# Altium footprint library Connector_PinHeader_1.00mm.PcbLib: 278 footprints (part 5 of 18)
Each footprint in its own frame and in the unit in brackets; x right, y up, seen from the top. Pads: shape width x height; smd on the part's side, far side on the other; paste and mask are expansions set on the pad; w line width, h text height; cw(c..) or ccw(c..) is an arc to the next point about the centre after c.
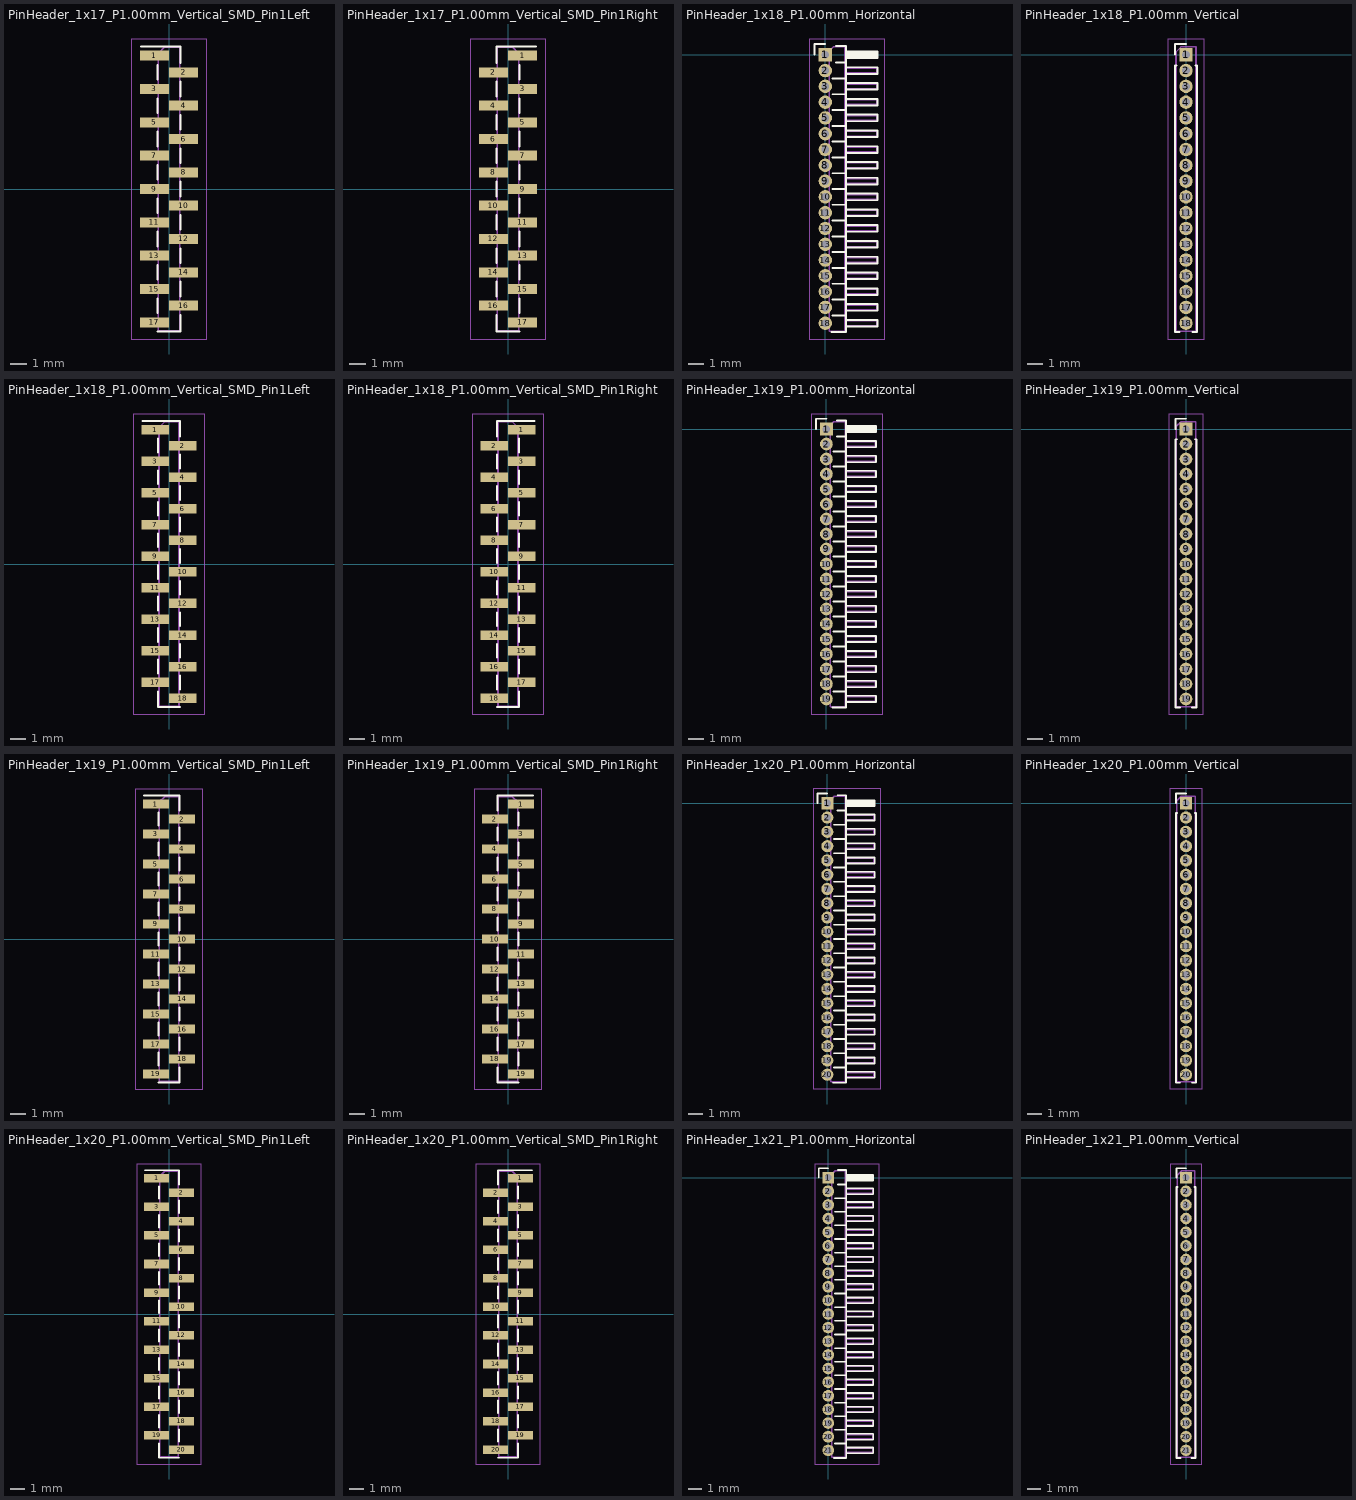
[diagram p4: the footprints below, top view; thin cyan lines are the x and y axes]

## PinHeader_1x17_P1.00mm_Vertical_SMD_Pin1Left [mm]
pads (17):
  rect 1.75x0.6 smd: 1(-0.875,8) 2(0.875,7) 3(-0.875,6) 4(0.875,5) 5(-0.875,4) 6(0.875,3) 7(-0.875,2) 8(0.875,1) 9(-0.875,0) 10(0.875,-1) 11(-0.875,-2) 12(0.875,-3) 13(-0.875,-4) 14(0.875,-5) 15(-0.875,-6) 16(0.875,-7) 17(-0.875,-8)
F.SilkS:
  lines w0.12: -1.69,8.56 -0.695,8.56 0.695,8.56 0.695,7.56 ; -0.695,-8.56 0.695,-8.56 0.695,-7.56 ; -0.695,-7.44 -0.695,-6.56 ; -0.695,-5.44 -0.695,-4.56 ; -0.695,-3.44 -0.695,-2.56 ; -0.695,-1.44 -0.695,-0.56 ; -0.695,0.56 -0.695,1.44 ; -0.695,2.56 -0.695,3.44 ; -0.695,4.56 -0.695,5.44 ; -0.695,6.56 -0.695,7.44 ; 0.695,-6.44 0.695,-5.56 ; 0.695,-4.44 0.695,-3.56 ; 0.695,-2.44 0.695,-1.56 ; 0.695,-0.44 0.695,0.44 ; 0.695,1.56 0.695,2.44 ; 0.695,3.56 0.695,4.44 ; 0.695,5.56 0.695,6.44
F.CrtYd:
  lines w0.05: -2.25,-9 2.25,-9 2.25,9 -2.25,9 -2.25,-9
F.Fab:
  lines w0.1: -0.635,-8.15 -1.25,-8.15 -1.25,-7.85 -0.635,-7.85 ; -0.635,-6.15 -1.25,-6.15 -1.25,-5.85 -0.635,-5.85 ; -0.635,-4.15 -1.25,-4.15 -1.25,-3.85 -0.635,-3.85 ; -0.635,-2.15 -1.25,-2.15 -1.25,-1.85 -0.635,-1.85 ; -0.635,-0.15 -1.25,-0.15 -1.25,0.15 -0.635,0.15 ; -0.635,1.85 -1.25,1.85 -1.25,2.15 -0.635,2.15 ; -0.635,3.85 -1.25,3.85 -1.25,4.15 -0.635,4.15 ; -0.635,5.85 -1.25,5.85 -1.25,6.15 -0.635,6.15 ; -0.635,7.85 -1.25,7.85 -1.25,8.15 -0.635,8.15 ; 0.635,-7.15 1.25,-7.15 1.25,-6.85 0.635,-6.85 ; 0.635,-5.15 1.25,-5.15 1.25,-4.85 0.635,-4.85 ; 0.635,-3.15 1.25,-3.15 1.25,-2.85 0.635,-2.85 ; 0.635,-1.15 1.25,-1.15 1.25,-0.85 0.635,-0.85 ; 0.635,0.85 1.25,0.85 1.25,1.15 0.635,1.15 ; 0.635,2.85 1.25,2.85 1.25,3.15 0.635,3.15 ; 0.635,4.85 1.25,4.85 1.25,5.15 0.635,5.15 ; 0.635,6.85 1.25,6.85 1.25,7.15 0.635,7.15 ; -0.635,8.15 -0.635,-8.5 0.635,-8.5 0.635,8.5 -0.285,8.5 -0.635,8.15
  text "'.Designator'" at 0.84,-4.047 h1

## PinHeader_1x17_P1.00mm_Vertical_SMD_Pin1Right [mm]
pads (17):
  rect 1.75x0.6 smd: 1(0.875,8) 2(-0.875,7) 3(0.875,6) 4(-0.875,5) 5(0.875,4) 6(-0.875,3) 7(0.875,2) 8(-0.875,1) 9(0.875,0) 10(-0.875,-1) 11(0.875,-2) 12(-0.875,-3) 13(0.875,-4) 14(-0.875,-5) 15(0.875,-6) 16(-0.875,-7) 17(0.875,-8)
F.SilkS:
  lines w0.12: -0.695,-7.56 -0.695,-8.56 0.695,-8.56 ; -0.695,-6.44 -0.695,-5.56 ; -0.695,-4.44 -0.695,-3.56 ; -0.695,-2.44 -0.695,-1.56 ; -0.695,-0.44 -0.695,0.44 ; -0.695,1.56 -0.695,2.44 ; -0.695,3.56 -0.695,4.44 ; -0.695,5.56 -0.695,6.44 ; -0.695,8.44 -0.695,7.56 -0.695,8.56 0.695,8.56 1.69,8.56 ; 0.695,-7.44 0.695,-6.56 ; 0.695,-5.44 0.695,-4.56 ; 0.695,-3.44 0.695,-2.56 ; 0.695,-1.44 0.695,-0.56 ; 0.695,0.56 0.695,1.44 ; 0.695,2.56 0.695,3.44 ; 0.695,4.56 0.695,5.44 ; 0.695,6.56 0.695,7.44
F.CrtYd:
  lines w0.05: -2.25,-9 -2.25,9 2.25,9 2.25,-9 -2.25,-9
F.Fab:
  lines w0.1: -0.635,-7.15 -1.25,-7.15 -1.25,-6.85 -0.635,-6.85 ; -0.635,-5.15 -1.25,-5.15 -1.25,-4.85 -0.635,-4.85 ; -0.635,-3.15 -1.25,-3.15 -1.25,-2.85 -0.635,-2.85 ; -0.635,-1.15 -1.25,-1.15 -1.25,-0.85 -0.635,-0.85 ; -0.635,0.85 -1.25,0.85 -1.25,1.15 -0.635,1.15 ; -0.635,2.85 -1.25,2.85 -1.25,3.15 -0.635,3.15 ; -0.635,4.85 -1.25,4.85 -1.25,5.15 -0.635,5.15 ; -0.635,6.85 -1.25,6.85 -1.25,7.15 -0.635,7.15 ; 0.635,-8.15 1.25,-8.15 1.25,-7.85 0.635,-7.85 ; 0.635,-6.15 1.25,-6.15 1.25,-5.85 0.635,-5.85 ; 0.635,-4.15 1.25,-4.15 1.25,-3.85 0.635,-3.85 ; 0.635,-2.15 1.25,-2.15 1.25,-1.85 0.635,-1.85 ; 0.635,-0.15 1.25,-0.15 1.25,0.15 0.635,0.15 ; 0.635,1.85 1.25,1.85 1.25,2.15 0.635,2.15 ; 0.635,3.85 1.25,3.85 1.25,4.15 0.635,4.15 ; 0.635,5.85 1.25,5.85 1.25,6.15 0.635,6.15 ; 0.635,7.85 1.25,7.85 1.25,8.15 0.635,8.15 ; 0.635,8.15 0.285,8.5 -0.635,8.5 -0.635,-8.5 0.635,-8.5 0.635,8.15
  text "'.Designator'" at 0.84,-4.047 h1

## PinHeader_1x18_P1.00mm_Horizontal [mm]
pads (18):
  rect 0.85x0.85 hole 0.5: 1(0,0)
  rrect100% 0.85x0.85 hole 0.5: 2(0,-1) 3(0,-2) 4(0,-3) 5(0,-4) 6(0,-5) 7(0,-6) 8(0,-7) 9(0,-8) 10(0,-9) 11(0,-10) 12(0,-11) 13(0,-12) 14(0,-13) 15(0,-14) 16(0,-15) 17(0,-16) 18(0,-17)
F.SilkS:
  lines w0.12: -0.685,0 -0.685,0.685 0,0.685 ; 0.394,-17.56 1.31,-17.56 1.31,0.56 0.685,0.56 ; 0.468,-16.5 1.31,-16.5 ; 0.468,-15.5 1.31,-15.5 ; 0.468,-14.5 1.31,-14.5 ; 0.468,-13.5 1.31,-13.5 ; 0.468,-12.5 1.31,-12.5 ; 0.468,-11.5 1.31,-11.5 ; 0.468,-10.5 1.31,-10.5 ; 0.468,-9.5 1.31,-9.5 ; 0.468,-8.5 1.31,-8.5 ; 0.468,-7.5 1.31,-7.5 ; 0.468,-6.5 1.31,-6.5 ; 0.468,-5.5 1.31,-5.5 ; 0.468,-4.5 1.31,-4.5 ; 0.468,-3.5 1.31,-3.5 ; 0.468,-2.5 1.31,-2.5 ; 0.468,-1.5 1.31,-1.5 ; 0.685,-0.5 1.31,-0.5 ; 1.31,-17.21 3.31,-17.21 3.31,-16.79 1.31,-16.79 ; 1.31,-16.21 3.31,-16.21 3.31,-15.79 1.31,-15.79 ; 1.31,-15.21 3.31,-15.21 3.31,-14.79 1.31,-14.79 ; 1.31,-14.21 3.31,-14.21 3.31,-13.79 1.31,-13.79 ; 1.31,-13.21 3.31,-13.21 3.31,-12.79 1.31,-12.79 ; 1.31,-12.21 3.31,-12.21 3.31,-11.79 1.31,-11.79 ; 1.31,-11.21 3.31,-11.21 3.31,-10.79 1.31,-10.79 ; 1.31,-10.21 3.31,-10.21 3.31,-9.79 1.31,-9.79 ; 1.31,-9.21 3.31,-9.21 3.31,-8.79 1.31,-8.79 ; 1.31,-8.21 3.31,-8.21 3.31,-7.79 1.31,-7.79 ; 1.31,-7.21 3.31,-7.21 3.31,-6.79 1.31,-6.79 ; 1.31,-6.21 3.31,-6.21 3.31,-5.79 1.31,-5.79 ; 1.31,-5.21 3.31,-5.21 3.31,-4.79 1.31,-4.79 ; 1.31,-4.21 3.31,-4.21 3.31,-3.79 1.31,-3.79 ; 1.31,-3.21 3.31,-3.21 3.31,-2.79 1.31,-2.79 ; 1.31,-2.21 3.31,-2.21 3.31,-1.79 1.31,-1.79 ; 1.31,-1.21 3.31,-1.21 3.31,-0.79 1.31,-0.79 ; 1.31,-0.21 3.31,-0.21 3.31,0.21 1.31,0.21 ; 1.31,-0.09 3.31,-0.09 ; 1.31,0.03 3.31,0.03 ; 1.31,0.15 3.31,0.15
F.CrtYd:
  lines w0.05: -1,-18 3.75,-18 3.75,1 -1,1 -1,-18
F.Fab:
  lines w0.1: 0.25,-17.15 -0.15,-17.15 -0.15,-16.85 0.25,-16.85 ; 0.25,-16.15 -0.15,-16.15 -0.15,-15.85 0.25,-15.85 ; 0.25,-15.15 -0.15,-15.15 -0.15,-14.85 0.25,-14.85 ; 0.25,-14.15 -0.15,-14.15 -0.15,-13.85 0.25,-13.85 ; 0.25,-13.15 -0.15,-13.15 -0.15,-12.85 0.25,-12.85 ; 0.25,-12.15 -0.15,-12.15 -0.15,-11.85 0.25,-11.85 ; 0.25,-11.15 -0.15,-11.15 -0.15,-10.85 0.25,-10.85 ; 0.25,-10.15 -0.15,-10.15 -0.15,-9.85 0.25,-9.85 ; 0.25,-9.15 -0.15,-9.15 -0.15,-8.85 0.25,-8.85 ; 0.25,-8.15 -0.15,-8.15 -0.15,-7.85 0.25,-7.85 ; 0.25,-7.15 -0.15,-7.15 -0.15,-6.85 0.25,-6.85 ; 0.25,-6.15 -0.15,-6.15 -0.15,-5.85 0.25,-5.85 ; 0.25,-5.15 -0.15,-5.15 -0.15,-4.85 0.25,-4.85 ; 0.25,-4.15 -0.15,-4.15 -0.15,-3.85 0.25,-3.85 ; 0.25,-3.15 -0.15,-3.15 -0.15,-2.85 0.25,-2.85 ; 0.25,-2.15 -0.15,-2.15 -0.15,-1.85 0.25,-1.85 ; 0.25,-1.15 -0.15,-1.15 -0.15,-0.85 0.25,-0.85 ; 0.25,-0.15 -0.15,-0.15 -0.15,0.15 0.25,0.15 ; 1.25,-17.15 3.25,-17.15 3.25,-16.85 1.25,-16.85 ; 1.25,-16.15 3.25,-16.15 3.25,-15.85 1.25,-15.85 ; 1.25,-15.15 3.25,-15.15 3.25,-14.85 1.25,-14.85 ; 1.25,-14.15 3.25,-14.15 3.25,-13.85 1.25,-13.85 ; 1.25,-13.15 3.25,-13.15 3.25,-12.85 1.25,-12.85 ; 1.25,-12.15 3.25,-12.15 3.25,-11.85 1.25,-11.85 ; 1.25,-11.15 3.25,-11.15 3.25,-10.85 1.25,-10.85 ; 1.25,-10.15 3.25,-10.15 3.25,-9.85 1.25,-9.85 ; 1.25,-9.15 3.25,-9.15 3.25,-8.85 1.25,-8.85 ; 1.25,-8.15 3.25,-8.15 3.25,-7.85 1.25,-7.85 ; 1.25,-7.15 3.25,-7.15 3.25,-6.85 1.25,-6.85 ; 1.25,-6.15 3.25,-6.15 3.25,-5.85 1.25,-5.85 ; 1.25,-5.15 3.25,-5.15 3.25,-4.85 1.25,-4.85 ; 1.25,-4.15 3.25,-4.15 3.25,-3.85 1.25,-3.85 ; 1.25,-3.15 3.25,-3.15 3.25,-2.85 1.25,-2.85 ; 1.25,-2.15 3.25,-2.15 3.25,-1.85 1.25,-1.85 ; 1.25,-1.15 3.25,-1.15 3.25,-0.85 1.25,-0.85 ; 1.25,-0.15 3.25,-0.15 3.25,0.15 1.25,0.15 ; 0.25,-17.5 0.25,0.25 0.5,0.5 1.25,0.5 1.25,-17.5 0.25,-17.5
  text "'.Designator'" at 1.254,-10.928 h0.6

## PinHeader_1x18_P1.00mm_Vertical [mm]
pads (18):
  rect 0.85x0.85 hole 0.5: 1(0,0)
  rrect100% 0.85x0.85 hole 0.5: 2(0,-1) 3(0,-2) 4(0,-3) 5(0,-4) 6(0,-5) 7(0,-6) 8(0,-7) 9(0,-8) 10(0,-9) 11(0,-10) 12(0,-11) 13(0,-12) 14(0,-13) 15(0,-14) 16(0,-15) 17(0,-16) 18(0,-17)
F.SilkS:
  lines w0.12: -0.695,0 -0.695,0.685 0,0.685 ; -0.608,-0.685 -0.695,-0.685 -0.695,-17.56 -0.394,-17.56 ; 0.394,-17.56 0.695,-17.56 0.695,-0.685 0.608,-0.685
F.CrtYd:
  lines w0.05: -1.15,-18 1.15,-18 1.15,1 -1.15,1 -1.15,-18
F.Fab:
  lines w0.1: -0.635,-17.5 -0.635,0.182 -0.318,0.5 0.635,0.5 0.635,-17.5 -0.635,-17.5
  text "'.Designator'" at 0.639,-11.576 h0.76

## PinHeader_1x18_P1.00mm_Vertical_SMD_Pin1Left [mm]
pads (18):
  rect 1.75x0.6 smd: 1(-0.875,8.5) 2(0.875,7.5) 3(-0.875,6.5) 4(0.875,5.5) 5(-0.875,4.5) 6(0.875,3.5) 7(-0.875,2.5) 8(0.875,1.5) 9(-0.875,0.5) 10(0.875,-0.5) 11(-0.875,-1.5) 12(0.875,-2.5) 13(-0.875,-3.5) 14(0.875,-4.5) 15(-0.875,-5.5) 16(0.875,-6.5) 17(-0.875,-7.5) 18(0.875,-8.5)
F.SilkS:
  lines w0.12: -1.69,9.06 -0.695,9.06 0.695,9.06 0.695,8.06 ; -0.695,-8.06 -0.695,-9.06 0.695,-9.06 ; -0.695,-6.94 -0.695,-6.06 ; -0.695,-4.94 -0.695,-4.06 ; -0.695,-2.94 -0.695,-2.06 ; -0.695,-0.94 -0.695,-0.06 ; -0.695,1.06 -0.695,1.94 ; -0.695,3.06 -0.695,3.94 ; -0.695,5.06 -0.695,5.94 ; -0.695,7.06 -0.695,7.94 ; 0.695,-7.94 0.695,-7.06 ; 0.695,-5.94 0.695,-5.06 ; 0.695,-3.94 0.695,-3.06 ; 0.695,-1.94 0.695,-1.06 ; 0.695,0.06 0.695,0.94 ; 0.695,2.06 0.695,2.94 ; 0.695,4.06 0.695,4.94 ; 0.695,6.06 0.695,6.94
F.CrtYd:
  lines w0.05: -2.25,-9.5 -2.25,9.5 2.25,9.5 2.25,-9.5 -2.25,-9.5
F.Fab:
  lines w0.1: -0.635,-7.65 -1.25,-7.65 -1.25,-7.35 -0.635,-7.35 ; -0.635,-5.65 -1.25,-5.65 -1.25,-5.35 -0.635,-5.35 ; -0.635,-3.65 -1.25,-3.65 -1.25,-3.35 -0.635,-3.35 ; -0.635,-1.65 -1.25,-1.65 -1.25,-1.35 -0.635,-1.35 ; -0.635,0.35 -1.25,0.35 -1.25,0.65 -0.635,0.65 ; -0.635,2.35 -1.25,2.35 -1.25,2.65 -0.635,2.65 ; -0.635,4.35 -1.25,4.35 -1.25,4.65 -0.635,4.65 ; -0.635,6.35 -1.25,6.35 -1.25,6.65 -0.635,6.65 ; -0.635,8.35 -1.25,8.35 -1.25,8.65 -0.635,8.65 ; 0.635,-8.65 1.25,-8.65 1.25,-8.35 0.635,-8.35 ; 0.635,-6.65 1.25,-6.65 1.25,-6.35 0.635,-6.35 ; 0.635,-4.65 1.25,-4.65 1.25,-4.35 0.635,-4.35 ; 0.635,-2.65 1.25,-2.65 1.25,-2.35 0.635,-2.35 ; 0.635,-0.65 1.25,-0.65 1.25,-0.35 0.635,-0.35 ; 0.635,1.35 1.25,1.35 1.25,1.65 0.635,1.65 ; 0.635,3.35 1.25,3.35 1.25,3.65 0.635,3.65 ; 0.635,5.35 1.25,5.35 1.25,5.65 0.635,5.65 ; 0.635,7.35 1.25,7.35 1.25,7.65 0.635,7.65 ; -0.635,8.65 -0.285,9 0.635,9 0.635,-9 -0.635,-9 -0.635,8.65
  text "'.Designator'" at 0.84,-4.047 h1

## PinHeader_1x18_P1.00mm_Vertical_SMD_Pin1Right [mm]
pads (18):
  rect 1.75x0.6 smd: 1(0.875,8.5) 2(-0.875,7.5) 3(0.875,6.5) 4(-0.875,5.5) 5(0.875,4.5) 6(-0.875,3.5) 7(0.875,2.5) 8(-0.875,1.5) 9(0.875,0.5) 10(-0.875,-0.5) 11(0.875,-1.5) 12(-0.875,-2.5) 13(0.875,-3.5) 14(-0.875,-4.5) 15(0.875,-5.5) 16(-0.875,-6.5) 17(0.875,-7.5) 18(-0.875,-8.5)
F.SilkS:
  lines w0.12: -0.695,-9.06 0.695,-9.06 0.695,-8.06 ; -0.695,-7.94 -0.695,-7.06 ; -0.695,-5.94 -0.695,-5.06 ; -0.695,-3.94 -0.695,-3.06 ; -0.695,-1.94 -0.695,-1.06 ; -0.695,0.06 -0.695,0.94 ; -0.695,2.06 -0.695,2.94 ; -0.695,4.06 -0.695,4.94 ; -0.695,6.06 -0.695,6.94 ; -0.695,8.94 -0.695,8.06 -0.695,9.06 0.695,9.06 1.69,9.06 ; 0.695,-6.94 0.695,-6.06 ; 0.695,-4.94 0.695,-4.06 ; 0.695,-2.94 0.695,-2.06 ; 0.695,-0.94 0.695,-0.06 ; 0.695,1.06 0.695,1.94 ; 0.695,3.06 0.695,3.94 ; 0.695,5.06 0.695,5.94 ; 0.695,7.06 0.695,7.94
F.CrtYd:
  lines w0.05: -2.25,-9.5 2.25,-9.5 2.25,9.5 -2.25,9.5 -2.25,-9.5
F.Fab:
  lines w0.1: -0.635,-8.65 -1.25,-8.65 -1.25,-8.35 -0.635,-8.35 ; -0.635,-6.65 -1.25,-6.65 -1.25,-6.35 -0.635,-6.35 ; -0.635,-4.65 -1.25,-4.65 -1.25,-4.35 -0.635,-4.35 ; -0.635,-2.65 -1.25,-2.65 -1.25,-2.35 -0.635,-2.35 ; -0.635,-0.65 -1.25,-0.65 -1.25,-0.35 -0.635,-0.35 ; -0.635,1.35 -1.25,1.35 -1.25,1.65 -0.635,1.65 ; -0.635,3.35 -1.25,3.35 -1.25,3.65 -0.635,3.65 ; -0.635,5.35 -1.25,5.35 -1.25,5.65 -0.635,5.65 ; -0.635,7.35 -1.25,7.35 -1.25,7.65 -0.635,7.65 ; 0.635,-7.65 1.25,-7.65 1.25,-7.35 0.635,-7.35 ; 0.635,-5.65 1.25,-5.65 1.25,-5.35 0.635,-5.35 ; 0.635,-3.65 1.25,-3.65 1.25,-3.35 0.635,-3.35 ; 0.635,-1.65 1.25,-1.65 1.25,-1.35 0.635,-1.35 ; 0.635,0.35 1.25,0.35 1.25,0.65 0.635,0.65 ; 0.635,2.35 1.25,2.35 1.25,2.65 0.635,2.65 ; 0.635,4.35 1.25,4.35 1.25,4.65 0.635,4.65 ; 0.635,6.35 1.25,6.35 1.25,6.65 0.635,6.65 ; 0.635,8.35 1.25,8.35 1.25,8.65 0.635,8.65 ; 0.635,8.65 0.285,9 -0.635,9 -0.635,-9 0.635,-9 0.635,8.65
  text "'.Designator'" at 0.84,-4.047 h1

## PinHeader_1x19_P1.00mm_Horizontal [mm]
pads (19):
  rect 0.85x0.85 hole 0.5: 1(0,0)
  rrect100% 0.85x0.85 hole 0.5: 2(0,-1) 3(0,-2) 4(0,-3) 5(0,-4) 6(0,-5) 7(0,-6) 8(0,-7) 9(0,-8) 10(0,-9) 11(0,-10) 12(0,-11) 13(0,-12) 14(0,-13) 15(0,-14) 16(0,-15) 17(0,-16) 18(0,-17) 19(0,-18)
F.SilkS:
  lines w0.12: -0.685,0 -0.685,0.685 0,0.685 ; 0.394,-18.56 1.31,-18.56 1.31,0.56 0.685,0.56 ; 0.468,-17.5 1.31,-17.5 ; 0.468,-16.5 1.31,-16.5 ; 0.468,-15.5 1.31,-15.5 ; 0.468,-14.5 1.31,-14.5 ; 0.468,-13.5 1.31,-13.5 ; 0.468,-12.5 1.31,-12.5 ; 0.468,-11.5 1.31,-11.5 ; 0.468,-10.5 1.31,-10.5 ; 0.468,-9.5 1.31,-9.5 ; 0.468,-8.5 1.31,-8.5 ; 0.468,-7.5 1.31,-7.5 ; 0.468,-6.5 1.31,-6.5 ; 0.468,-5.5 1.31,-5.5 ; 0.468,-4.5 1.31,-4.5 ; 0.468,-3.5 1.31,-3.5 ; 0.468,-2.5 1.31,-2.5 ; 0.468,-1.5 1.31,-1.5 ; 0.685,-0.5 1.31,-0.5 ; 1.31,-18.21 3.31,-18.21 3.31,-17.79 1.31,-17.79 ; 1.31,-17.21 3.31,-17.21 3.31,-16.79 1.31,-16.79 ; 1.31,-16.21 3.31,-16.21 3.31,-15.79 1.31,-15.79 ; 1.31,-15.21 3.31,-15.21 3.31,-14.79 1.31,-14.79 ; 1.31,-14.21 3.31,-14.21 3.31,-13.79 1.31,-13.79 ; 1.31,-13.21 3.31,-13.21 3.31,-12.79 1.31,-12.79 ; 1.31,-12.21 3.31,-12.21 3.31,-11.79 1.31,-11.79 ; 1.31,-11.21 3.31,-11.21 3.31,-10.79 1.31,-10.79 ; 1.31,-10.21 3.31,-10.21 3.31,-9.79 1.31,-9.79 ; 1.31,-9.21 3.31,-9.21 3.31,-8.79 1.31,-8.79 ; 1.31,-8.21 3.31,-8.21 3.31,-7.79 1.31,-7.79 ; 1.31,-7.21 3.31,-7.21 3.31,-6.79 1.31,-6.79 ; 1.31,-6.21 3.31,-6.21 3.31,-5.79 1.31,-5.79 ; 1.31,-5.21 3.31,-5.21 3.31,-4.79 1.31,-4.79 ; 1.31,-4.21 3.31,-4.21 3.31,-3.79 1.31,-3.79 ; 1.31,-3.21 3.31,-3.21 3.31,-2.79 1.31,-2.79 ; 1.31,-2.21 3.31,-2.21 3.31,-1.79 1.31,-1.79 ; 1.31,-1.21 3.31,-1.21 3.31,-0.79 1.31,-0.79 ; 1.31,-0.21 3.31,-0.21 3.31,0.21 1.31,0.21 ; 1.31,-0.09 3.31,-0.09 ; 1.31,0.03 3.31,0.03 ; 1.31,0.15 3.31,0.15
F.CrtYd:
  lines w0.05: -1,-19 3.75,-19 3.75,1 -1,1 -1,-19
F.Fab:
  lines w0.1: 0.25,-18.15 -0.15,-18.15 -0.15,-17.85 0.25,-17.85 ; 0.25,-17.15 -0.15,-17.15 -0.15,-16.85 0.25,-16.85 ; 0.25,-16.15 -0.15,-16.15 -0.15,-15.85 0.25,-15.85 ; 0.25,-15.15 -0.15,-15.15 -0.15,-14.85 0.25,-14.85 ; 0.25,-14.15 -0.15,-14.15 -0.15,-13.85 0.25,-13.85 ; 0.25,-13.15 -0.15,-13.15 -0.15,-12.85 0.25,-12.85 ; 0.25,-12.15 -0.15,-12.15 -0.15,-11.85 0.25,-11.85 ; 0.25,-11.15 -0.15,-11.15 -0.15,-10.85 0.25,-10.85 ; 0.25,-10.15 -0.15,-10.15 -0.15,-9.85 0.25,-9.85 ; 0.25,-9.15 -0.15,-9.15 -0.15,-8.85 0.25,-8.85 ; 0.25,-8.15 -0.15,-8.15 -0.15,-7.85 0.25,-7.85 ; 0.25,-7.15 -0.15,-7.15 -0.15,-6.85 0.25,-6.85 ; 0.25,-6.15 -0.15,-6.15 -0.15,-5.85 0.25,-5.85 ; 0.25,-5.15 -0.15,-5.15 -0.15,-4.85 0.25,-4.85 ; 0.25,-4.15 -0.15,-4.15 -0.15,-3.85 0.25,-3.85 ; 0.25,-3.15 -0.15,-3.15 -0.15,-2.85 0.25,-2.85 ; 0.25,-2.15 -0.15,-2.15 -0.15,-1.85 0.25,-1.85 ; 0.25,-1.15 -0.15,-1.15 -0.15,-0.85 0.25,-0.85 ; 0.25,-0.15 -0.15,-0.15 -0.15,0.15 0.25,0.15 ; 1.25,-18.15 3.25,-18.15 3.25,-17.85 1.25,-17.85 ; 1.25,-17.15 3.25,-17.15 3.25,-16.85 1.25,-16.85 ; 1.25,-16.15 3.25,-16.15 3.25,-15.85 1.25,-15.85 ; 1.25,-15.15 3.25,-15.15 3.25,-14.85 1.25,-14.85 ; 1.25,-14.15 3.25,-14.15 3.25,-13.85 1.25,-13.85 ; 1.25,-13.15 3.25,-13.15 3.25,-12.85 1.25,-12.85 ; 1.25,-12.15 3.25,-12.15 3.25,-11.85 1.25,-11.85 ; 1.25,-11.15 3.25,-11.15 3.25,-10.85 1.25,-10.85 ; 1.25,-10.15 3.25,-10.15 3.25,-9.85 1.25,-9.85 ; 1.25,-9.15 3.25,-9.15 3.25,-8.85 1.25,-8.85 ; 1.25,-8.15 3.25,-8.15 3.25,-7.85 1.25,-7.85 ; 1.25,-7.15 3.25,-7.15 3.25,-6.85 1.25,-6.85 ; 1.25,-6.15 3.25,-6.15 3.25,-5.85 1.25,-5.85 ; 1.25,-5.15 3.25,-5.15 3.25,-4.85 1.25,-4.85 ; 1.25,-4.15 3.25,-4.15 3.25,-3.85 1.25,-3.85 ; 1.25,-3.15 3.25,-3.15 3.25,-2.85 1.25,-2.85 ; 1.25,-2.15 3.25,-2.15 3.25,-1.85 1.25,-1.85 ; 1.25,-1.15 3.25,-1.15 3.25,-0.85 1.25,-0.85 ; 1.25,-0.15 3.25,-0.15 3.25,0.15 1.25,0.15 ; 0.25,-18.5 0.25,0.25 0.5,0.5 1.25,0.5 1.25,-18.5 0.25,-18.5
  text "'.Designator'" at 1.254,-11.428 h0.6

## PinHeader_1x19_P1.00mm_Vertical [mm]
pads (19):
  rect 0.85x0.85 hole 0.5: 1(0,0)
  rrect100% 0.85x0.85 hole 0.5: 2(0,-1) 3(0,-2) 4(0,-3) 5(0,-4) 6(0,-5) 7(0,-6) 8(0,-7) 9(0,-8) 10(0,-9) 11(0,-10) 12(0,-11) 13(0,-12) 14(0,-13) 15(0,-14) 16(0,-15) 17(0,-16) 18(0,-17) 19(0,-18)
F.SilkS:
  lines w0.12: -0.695,0 -0.695,0.685 0,0.685 ; -0.608,-0.685 -0.695,-0.685 -0.695,-18.56 -0.394,-18.56 ; 0.394,-18.56 0.695,-18.56 0.695,-0.685 0.608,-0.685
F.CrtYd:
  lines w0.05: -1.15,-19 1.15,-19 1.15,1 -1.15,1 -1.15,-19
F.Fab:
  lines w0.1: -0.635,-18.5 0.635,-18.5 0.635,0.5 -0.318,0.5 -0.635,0.182 -0.635,-18.5
  text "'.Designator'" at 0.639,-12.076 h0.76

## PinHeader_1x19_P1.00mm_Vertical_SMD_Pin1Left [mm]
pads (19):
  rect 1.75x0.6 smd: 1(-0.875,9) 2(0.875,8) 3(-0.875,7) 4(0.875,6) 5(-0.875,5) 6(0.875,4) 7(-0.875,3) 8(0.875,2) 9(-0.875,1) 10(0.875,0) 11(-0.875,-1) 12(0.875,-2) 13(-0.875,-3) 14(0.875,-4) 15(-0.875,-5) 16(0.875,-6) 17(-0.875,-7) 18(0.875,-8) 19(-0.875,-9)
F.SilkS:
  lines w0.12: -1.69,9.56 -0.695,9.56 0.695,9.56 0.695,8.56 ; -0.695,-9.56 0.695,-9.56 0.695,-8.56 ; -0.695,-8.44 -0.695,-7.56 ; -0.695,-6.44 -0.695,-5.56 ; -0.695,-4.44 -0.695,-3.56 ; -0.695,-2.44 -0.695,-1.56 ; -0.695,-0.44 -0.695,0.44 ; -0.695,1.56 -0.695,2.44 ; -0.695,3.56 -0.695,4.44 ; -0.695,5.56 -0.695,6.44 ; -0.695,7.56 -0.695,8.44 ; 0.695,-7.44 0.695,-6.56 ; 0.695,-5.44 0.695,-4.56 ; 0.695,-3.44 0.695,-2.56 ; 0.695,-1.44 0.695,-0.56 ; 0.695,0.56 0.695,1.44 ; 0.695,2.56 0.695,3.44 ; 0.695,4.56 0.695,5.44 ; 0.695,6.56 0.695,7.44
F.CrtYd:
  lines w0.05: -2.25,-10 -2.25,10 2.25,10 2.25,-10 -2.25,-10
F.Fab:
  lines w0.1: -0.635,-9.15 -1.25,-9.15 -1.25,-8.85 -0.635,-8.85 ; -0.635,-7.15 -1.25,-7.15 -1.25,-6.85 -0.635,-6.85 ; -0.635,-5.15 -1.25,-5.15 -1.25,-4.85 -0.635,-4.85 ; -0.635,-3.15 -1.25,-3.15 -1.25,-2.85 -0.635,-2.85 ; -0.635,-1.15 -1.25,-1.15 -1.25,-0.85 -0.635,-0.85 ; -0.635,0.85 -1.25,0.85 -1.25,1.15 -0.635,1.15 ; -0.635,2.85 -1.25,2.85 -1.25,3.15 -0.635,3.15 ; -0.635,4.85 -1.25,4.85 -1.25,5.15 -0.635,5.15 ; -0.635,6.85 -1.25,6.85 -1.25,7.15 -0.635,7.15 ; -0.635,8.85 -1.25,8.85 -1.25,9.15 -0.635,9.15 ; 0.635,-8.15 1.25,-8.15 1.25,-7.85 0.635,-7.85 ; 0.635,-6.15 1.25,-6.15 1.25,-5.85 0.635,-5.85 ; 0.635,-4.15 1.25,-4.15 1.25,-3.85 0.635,-3.85 ; 0.635,-2.15 1.25,-2.15 1.25,-1.85 0.635,-1.85 ; 0.635,-0.15 1.25,-0.15 1.25,0.15 0.635,0.15 ; 0.635,1.85 1.25,1.85 1.25,2.15 0.635,2.15 ; 0.635,3.85 1.25,3.85 1.25,4.15 0.635,4.15 ; 0.635,5.85 1.25,5.85 1.25,6.15 0.635,6.15 ; 0.635,7.85 1.25,7.85 1.25,8.15 0.635,8.15 ; -0.635,9.15 -0.635,-9.5 0.635,-9.5 0.635,9.5 -0.285,9.5 -0.635,9.15
  text "'.Designator'" at 0.84,-4.047 h1

## PinHeader_1x19_P1.00mm_Vertical_SMD_Pin1Right [mm]
pads (19):
  rect 1.75x0.6 smd: 1(0.875,9) 2(-0.875,8) 3(0.875,7) 4(-0.875,6) 5(0.875,5) 6(-0.875,4) 7(0.875,3) 8(-0.875,2) 9(0.875,1) 10(-0.875,0) 11(0.875,-1) 12(-0.875,-2) 13(0.875,-3) 14(-0.875,-4) 15(0.875,-5) 16(-0.875,-6) 17(0.875,-7) 18(-0.875,-8) 19(0.875,-9)
F.SilkS:
  lines w0.12: -0.695,-8.56 -0.695,-9.56 0.695,-9.56 ; -0.695,-7.44 -0.695,-6.56 ; -0.695,-5.44 -0.695,-4.56 ; -0.695,-3.44 -0.695,-2.56 ; -0.695,-1.44 -0.695,-0.56 ; -0.695,0.56 -0.695,1.44 ; -0.695,2.56 -0.695,3.44 ; -0.695,4.56 -0.695,5.44 ; -0.695,6.56 -0.695,7.44 ; -0.695,9.44 -0.695,8.56 -0.695,9.56 0.695,9.56 1.69,9.56 ; 0.695,-8.44 0.695,-7.56 ; 0.695,-6.44 0.695,-5.56 ; 0.695,-4.44 0.695,-3.56 ; 0.695,-2.44 0.695,-1.56 ; 0.695,-0.44 0.695,0.44 ; 0.695,1.56 0.695,2.44 ; 0.695,3.56 0.695,4.44 ; 0.695,5.56 0.695,6.44 ; 0.695,7.56 0.695,8.44
F.CrtYd:
  lines w0.05: -2.25,-10 -2.25,10 2.25,10 2.25,-10 -2.25,-10
F.Fab:
  lines w0.1: -0.635,-8.15 -1.25,-8.15 -1.25,-7.85 -0.635,-7.85 ; -0.635,-6.15 -1.25,-6.15 -1.25,-5.85 -0.635,-5.85 ; -0.635,-4.15 -1.25,-4.15 -1.25,-3.85 -0.635,-3.85 ; -0.635,-2.15 -1.25,-2.15 -1.25,-1.85 -0.635,-1.85 ; -0.635,-0.15 -1.25,-0.15 -1.25,0.15 -0.635,0.15 ; -0.635,1.85 -1.25,1.85 -1.25,2.15 -0.635,2.15 ; -0.635,3.85 -1.25,3.85 -1.25,4.15 -0.635,4.15 ; -0.635,5.85 -1.25,5.85 -1.25,6.15 -0.635,6.15 ; -0.635,7.85 -1.25,7.85 -1.25,8.15 -0.635,8.15 ; 0.635,-9.15 1.25,-9.15 1.25,-8.85 0.635,-8.85 ; 0.635,-7.15 1.25,-7.15 1.25,-6.85 0.635,-6.85 ; 0.635,-5.15 1.25,-5.15 1.25,-4.85 0.635,-4.85 ; 0.635,-3.15 1.25,-3.15 1.25,-2.85 0.635,-2.85 ; 0.635,-1.15 1.25,-1.15 1.25,-0.85 0.635,-0.85 ; 0.635,0.85 1.25,0.85 1.25,1.15 0.635,1.15 ; 0.635,2.85 1.25,2.85 1.25,3.15 0.635,3.15 ; 0.635,4.85 1.25,4.85 1.25,5.15 0.635,5.15 ; 0.635,6.85 1.25,6.85 1.25,7.15 0.635,7.15 ; 0.635,8.85 1.25,8.85 1.25,9.15 0.635,9.15 ; 0.635,9.15 0.635,-9.5 -0.635,-9.5 -0.635,9.5 0.285,9.5 0.635,9.15
  text "'.Designator'" at 0.84,-4.047 h1

## PinHeader_1x20_P1.00mm_Horizontal [mm]
pads (20):
  rect 0.85x0.85 hole 0.5: 1(0,0)
  rrect100% 0.85x0.85 hole 0.5: 2(0,-1) 3(0,-2) 4(0,-3) 5(0,-4) 6(0,-5) 7(0,-6) 8(0,-7) 9(0,-8) 10(0,-9) 11(0,-10) 12(0,-11) 13(0,-12) 14(0,-13) 15(0,-14) 16(0,-15) 17(0,-16) 18(0,-17) 19(0,-18) 20(0,-19)
F.SilkS:
  lines w0.12: -0.685,0 -0.685,0.685 0,0.685 ; 0.394,-19.56 1.31,-19.56 1.31,0.56 0.685,0.56 ; 0.468,-18.5 1.31,-18.5 ; 0.468,-17.5 1.31,-17.5 ; 0.468,-16.5 1.31,-16.5 ; 0.468,-15.5 1.31,-15.5 ; 0.468,-14.5 1.31,-14.5 ; 0.468,-13.5 1.31,-13.5 ; 0.468,-12.5 1.31,-12.5 ; 0.468,-11.5 1.31,-11.5 ; 0.468,-10.5 1.31,-10.5 ; 0.468,-9.5 1.31,-9.5 ; 0.468,-8.5 1.31,-8.5 ; 0.468,-7.5 1.31,-7.5 ; 0.468,-6.5 1.31,-6.5 ; 0.468,-5.5 1.31,-5.5 ; 0.468,-4.5 1.31,-4.5 ; 0.468,-3.5 1.31,-3.5 ; 0.468,-2.5 1.31,-2.5 ; 0.468,-1.5 1.31,-1.5 ; 0.685,-0.5 1.31,-0.5 ; 1.31,-19.21 3.31,-19.21 3.31,-18.79 1.31,-18.79 ; 1.31,-18.21 3.31,-18.21 3.31,-17.79 1.31,-17.79 ; 1.31,-17.21 3.31,-17.21 3.31,-16.79 1.31,-16.79 ; 1.31,-16.21 3.31,-16.21 3.31,-15.79 1.31,-15.79 ; 1.31,-15.21 3.31,-15.21 3.31,-14.79 1.31,-14.79 ; 1.31,-14.21 3.31,-14.21 3.31,-13.79 1.31,-13.79 ; 1.31,-13.21 3.31,-13.21 3.31,-12.79 1.31,-12.79 ; 1.31,-12.21 3.31,-12.21 3.31,-11.79 1.31,-11.79 ; 1.31,-11.21 3.31,-11.21 3.31,-10.79 1.31,-10.79 ; 1.31,-10.21 3.31,-10.21 3.31,-9.79 1.31,-9.79 ; 1.31,-9.21 3.31,-9.21 3.31,-8.79 1.31,-8.79 ; 1.31,-8.21 3.31,-8.21 3.31,-7.79 1.31,-7.79 ; 1.31,-7.21 3.31,-7.21 3.31,-6.79 1.31,-6.79 ; 1.31,-6.21 3.31,-6.21 3.31,-5.79 1.31,-5.79 ; 1.31,-5.21 3.31,-5.21 3.31,-4.79 1.31,-4.79 ; 1.31,-4.21 3.31,-4.21 3.31,-3.79 1.31,-3.79 ; 1.31,-3.21 3.31,-3.21 3.31,-2.79 1.31,-2.79 ; 1.31,-2.21 3.31,-2.21 3.31,-1.79 1.31,-1.79 ; 1.31,-1.21 3.31,-1.21 3.31,-0.79 1.31,-0.79 ; 1.31,-0.21 3.31,-0.21 3.31,0.21 1.31,0.21 ; 1.31,-0.09 3.31,-0.09 ; 1.31,0.03 3.31,0.03 ; 1.31,0.15 3.31,0.15
F.CrtYd:
  lines w0.05: -1,-20 3.75,-20 3.75,1 -1,1 -1,-20
F.Fab:
  lines w0.1: 0.25,-19.15 -0.15,-19.15 -0.15,-18.85 0.25,-18.85 ; 0.25,-18.15 -0.15,-18.15 -0.15,-17.85 0.25,-17.85 ; 0.25,-17.15 -0.15,-17.15 -0.15,-16.85 0.25,-16.85 ; 0.25,-16.15 -0.15,-16.15 -0.15,-15.85 0.25,-15.85 ; 0.25,-15.15 -0.15,-15.15 -0.15,-14.85 0.25,-14.85 ; 0.25,-14.15 -0.15,-14.15 -0.15,-13.85 0.25,-13.85 ; 0.25,-13.15 -0.15,-13.15 -0.15,-12.85 0.25,-12.85 ; 0.25,-12.15 -0.15,-12.15 -0.15,-11.85 0.25,-11.85 ; 0.25,-11.15 -0.15,-11.15 -0.15,-10.85 0.25,-10.85 ; 0.25,-10.15 -0.15,-10.15 -0.15,-9.85 0.25,-9.85 ; 0.25,-9.15 -0.15,-9.15 -0.15,-8.85 0.25,-8.85 ; 0.25,-8.15 -0.15,-8.15 -0.15,-7.85 0.25,-7.85 ; 0.25,-7.15 -0.15,-7.15 -0.15,-6.85 0.25,-6.85 ; 0.25,-6.15 -0.15,-6.15 -0.15,-5.85 0.25,-5.85 ; 0.25,-5.15 -0.15,-5.15 -0.15,-4.85 0.25,-4.85 ; 0.25,-4.15 -0.15,-4.15 -0.15,-3.85 0.25,-3.85 ; 0.25,-3.15 -0.15,-3.15 -0.15,-2.85 0.25,-2.85 ; 0.25,-2.15 -0.15,-2.15 -0.15,-1.85 0.25,-1.85 ; 0.25,-1.15 -0.15,-1.15 -0.15,-0.85 0.25,-0.85 ; 0.25,-0.15 -0.15,-0.15 -0.15,0.15 0.25,0.15 ; 1.25,-19.15 3.25,-19.15 3.25,-18.85 1.25,-18.85 ; 1.25,-18.15 3.25,-18.15 3.25,-17.85 1.25,-17.85 ; 1.25,-17.15 3.25,-17.15 3.25,-16.85 1.25,-16.85 ; 1.25,-16.15 3.25,-16.15 3.25,-15.85 1.25,-15.85 ; 1.25,-15.15 3.25,-15.15 3.25,-14.85 1.25,-14.85 ; 1.25,-14.15 3.25,-14.15 3.25,-13.85 1.25,-13.85 ; 1.25,-13.15 3.25,-13.15 3.25,-12.85 1.25,-12.85 ; 1.25,-12.15 3.25,-12.15 3.25,-11.85 1.25,-11.85 ; 1.25,-11.15 3.25,-11.15 3.25,-10.85 1.25,-10.85 ; 1.25,-10.15 3.25,-10.15 3.25,-9.85 1.25,-9.85 ; 1.25,-9.15 3.25,-9.15 3.25,-8.85 1.25,-8.85 ; 1.25,-8.15 3.25,-8.15 3.25,-7.85 1.25,-7.85 ; 1.25,-7.15 3.25,-7.15 3.25,-6.85 1.25,-6.85 ; 1.25,-6.15 3.25,-6.15 3.25,-5.85 1.25,-5.85 ; 1.25,-5.15 3.25,-5.15 3.25,-4.85 1.25,-4.85 ; 1.25,-4.15 3.25,-4.15 3.25,-3.85 1.25,-3.85 ; 1.25,-3.15 3.25,-3.15 3.25,-2.85 1.25,-2.85 ; 1.25,-2.15 3.25,-2.15 3.25,-1.85 1.25,-1.85 ; 1.25,-1.15 3.25,-1.15 3.25,-0.85 1.25,-0.85 ; 1.25,-0.15 3.25,-0.15 3.25,0.15 1.25,0.15 ; 0.25,-19.5 1.25,-19.5 1.25,0.5 0.5,0.5 0.25,0.25 0.25,-19.5
  text "'.Designator'" at 1.254,-11.928 h0.6

## PinHeader_1x20_P1.00mm_Vertical [mm]
pads (20):
  rect 0.85x0.85 hole 0.5: 1(0,0)
  rrect100% 0.85x0.85 hole 0.5: 2(0,-1) 3(0,-2) 4(0,-3) 5(0,-4) 6(0,-5) 7(0,-6) 8(0,-7) 9(0,-8) 10(0,-9) 11(0,-10) 12(0,-11) 13(0,-12) 14(0,-13) 15(0,-14) 16(0,-15) 17(0,-16) 18(0,-17) 19(0,-18) 20(0,-19)
F.SilkS:
  lines w0.12: -0.695,0 -0.695,0.685 0,0.685 ; -0.608,-0.685 -0.695,-0.685 -0.695,-19.56 -0.394,-19.56 ; 0.394,-19.56 0.695,-19.56 0.695,-0.685 0.608,-0.685
F.CrtYd:
  lines w0.05: -1.15,-20 1.15,-20 1.15,1 -1.15,1 -1.15,-20
F.Fab:
  lines w0.1: -0.635,-19.5 0.635,-19.5 0.635,0.5 -0.318,0.5 -0.635,0.182 -0.635,-19.5
  text "'.Designator'" at 0.639,-12.576 h0.76

## PinHeader_1x20_P1.00mm_Vertical_SMD_Pin1Left [mm]
pads (20):
  rect 1.75x0.6 smd: 1(-0.875,9.5) 2(0.875,8.5) 3(-0.875,7.5) 4(0.875,6.5) 5(-0.875,5.5) 6(0.875,4.5) 7(-0.875,3.5) 8(0.875,2.5) 9(-0.875,1.5) 10(0.875,0.5) 11(-0.875,-0.5) 12(0.875,-1.5) 13(-0.875,-2.5) 14(0.875,-3.5) 15(-0.875,-4.5) 16(0.875,-5.5) 17(-0.875,-6.5) 18(0.875,-7.5) 19(-0.875,-8.5) 20(0.875,-9.5)
F.SilkS:
  lines w0.12: -1.69,10.06 -0.695,10.06 0.695,10.06 0.695,9.06 ; -0.695,-9.06 -0.695,-10.06 0.695,-10.06 ; -0.695,-7.94 -0.695,-7.06 ; -0.695,-5.94 -0.695,-5.06 ; -0.695,-3.94 -0.695,-3.06 ; -0.695,-1.94 -0.695,-1.06 ; -0.695,0.06 -0.695,0.94 ; -0.695,2.06 -0.695,2.94 ; -0.695,4.06 -0.695,4.94 ; -0.695,6.06 -0.695,6.94 ; -0.695,8.06 -0.695,8.94 ; 0.695,-8.94 0.695,-8.06 ; 0.695,-6.94 0.695,-6.06 ; 0.695,-4.94 0.695,-4.06 ; 0.695,-2.94 0.695,-2.06 ; 0.695,-0.94 0.695,-0.06 ; 0.695,1.06 0.695,1.94 ; 0.695,3.06 0.695,3.94 ; 0.695,5.06 0.695,5.94 ; 0.695,7.06 0.695,7.94
F.CrtYd:
  lines w0.05: -2.25,-10.5 -2.25,10.5 2.25,10.5 2.25,-10.5 -2.25,-10.5
F.Fab:
  lines w0.1: -0.635,-8.65 -1.25,-8.65 -1.25,-8.35 -0.635,-8.35 ; -0.635,-6.65 -1.25,-6.65 -1.25,-6.35 -0.635,-6.35 ; -0.635,-4.65 -1.25,-4.65 -1.25,-4.35 -0.635,-4.35 ; -0.635,-2.65 -1.25,-2.65 -1.25,-2.35 -0.635,-2.35 ; -0.635,-0.65 -1.25,-0.65 -1.25,-0.35 -0.635,-0.35 ; -0.635,1.35 -1.25,1.35 -1.25,1.65 -0.635,1.65 ; -0.635,3.35 -1.25,3.35 -1.25,3.65 -0.635,3.65 ; -0.635,5.35 -1.25,5.35 -1.25,5.65 -0.635,5.65 ; -0.635,7.35 -1.25,7.35 -1.25,7.65 -0.635,7.65 ; -0.635,9.35 -1.25,9.35 -1.25,9.65 -0.635,9.65 ; 0.635,-9.65 1.25,-9.65 1.25,-9.35 0.635,-9.35 ; 0.635,-7.65 1.25,-7.65 1.25,-7.35 0.635,-7.35 ; 0.635,-5.65 1.25,-5.65 1.25,-5.35 0.635,-5.35 ; 0.635,-3.65 1.25,-3.65 1.25,-3.35 0.635,-3.35 ; 0.635,-1.65 1.25,-1.65 1.25,-1.35 0.635,-1.35 ; 0.635,0.35 1.25,0.35 1.25,0.65 0.635,0.65 ; 0.635,2.35 1.25,2.35 1.25,2.65 0.635,2.65 ; 0.635,4.35 1.25,4.35 1.25,4.65 0.635,4.65 ; 0.635,6.35 1.25,6.35 1.25,6.65 0.635,6.65 ; 0.635,8.35 1.25,8.35 1.25,8.65 0.635,8.65 ; -0.635,9.65 -0.635,-10 0.635,-10 0.635,10 -0.285,10 -0.635,9.65
  text "'.Designator'" at 0.84,-4.047 h1

## PinHeader_1x20_P1.00mm_Vertical_SMD_Pin1Right [mm]
pads (20):
  rect 1.75x0.6 smd: 1(0.875,9.5) 2(-0.875,8.5) 3(0.875,7.5) 4(-0.875,6.5) 5(0.875,5.5) 6(-0.875,4.5) 7(0.875,3.5) 8(-0.875,2.5) 9(0.875,1.5) 10(-0.875,0.5) 11(0.875,-0.5) 12(-0.875,-1.5) 13(0.875,-2.5) 14(-0.875,-3.5) 15(0.875,-4.5) 16(-0.875,-5.5) 17(0.875,-6.5) 18(-0.875,-7.5) 19(0.875,-8.5) 20(-0.875,-9.5)
F.SilkS:
  lines w0.12: -0.695,-10.06 0.695,-10.06 0.695,-9.06 ; -0.695,-8.94 -0.695,-8.06 ; -0.695,-6.94 -0.695,-6.06 ; -0.695,-4.94 -0.695,-4.06 ; -0.695,-2.94 -0.695,-2.06 ; -0.695,-0.94 -0.695,-0.06 ; -0.695,1.06 -0.695,1.94 ; -0.695,3.06 -0.695,3.94 ; -0.695,5.06 -0.695,5.94 ; -0.695,7.06 -0.695,7.94 ; -0.695,9.94 -0.695,9.06 -0.695,10.06 0.695,10.06 1.69,10.06 ; 0.695,-7.94 0.695,-7.06 ; 0.695,-5.94 0.695,-5.06 ; 0.695,-3.94 0.695,-3.06 ; 0.695,-1.94 0.695,-1.06 ; 0.695,0.06 0.695,0.94 ; 0.695,2.06 0.695,2.94 ; 0.695,4.06 0.695,4.94 ; 0.695,6.06 0.695,6.94 ; 0.695,8.06 0.695,8.94
F.CrtYd:
  lines w0.05: -2.25,-10.5 2.25,-10.5 2.25,10.5 -2.25,10.5 -2.25,-10.5
F.Fab:
  lines w0.1: -0.635,-9.65 -1.25,-9.65 -1.25,-9.35 -0.635,-9.35 ; -0.635,-7.65 -1.25,-7.65 -1.25,-7.35 -0.635,-7.35 ; -0.635,-5.65 -1.25,-5.65 -1.25,-5.35 -0.635,-5.35 ; -0.635,-3.65 -1.25,-3.65 -1.25,-3.35 -0.635,-3.35 ; -0.635,-1.65 -1.25,-1.65 -1.25,-1.35 -0.635,-1.35 ; -0.635,0.35 -1.25,0.35 -1.25,0.65 -0.635,0.65 ; -0.635,2.35 -1.25,2.35 -1.25,2.65 -0.635,2.65 ; -0.635,4.35 -1.25,4.35 -1.25,4.65 -0.635,4.65 ; -0.635,6.35 -1.25,6.35 -1.25,6.65 -0.635,6.65 ; -0.635,8.35 -1.25,8.35 -1.25,8.65 -0.635,8.65 ; 0.635,-8.65 1.25,-8.65 1.25,-8.35 0.635,-8.35 ; 0.635,-6.65 1.25,-6.65 1.25,-6.35 0.635,-6.35 ; 0.635,-4.65 1.25,-4.65 1.25,-4.35 0.635,-4.35 ; 0.635,-2.65 1.25,-2.65 1.25,-2.35 0.635,-2.35 ; 0.635,-0.65 1.25,-0.65 1.25,-0.35 0.635,-0.35 ; 0.635,1.35 1.25,1.35 1.25,1.65 0.635,1.65 ; 0.635,3.35 1.25,3.35 1.25,3.65 0.635,3.65 ; 0.635,5.35 1.25,5.35 1.25,5.65 0.635,5.65 ; 0.635,7.35 1.25,7.35 1.25,7.65 0.635,7.65 ; 0.635,9.35 1.25,9.35 1.25,9.65 0.635,9.65 ; 0.635,9.65 0.635,-10 -0.635,-10 -0.635,10 0.285,10 0.635,9.65
  text "'.Designator'" at 0.84,-4.047 h1

## PinHeader_1x21_P1.00mm_Horizontal [mm]
pads (21):
  rect 0.85x0.85 hole 0.5: 1(0,0)
  rrect100% 0.85x0.85 hole 0.5: 2(0,-1) 3(0,-2) 4(0,-3) 5(0,-4) 6(0,-5) 7(0,-6) 8(0,-7) 9(0,-8) 10(0,-9) 11(0,-10) 12(0,-11) 13(0,-12) 14(0,-13) 15(0,-14) 16(0,-15) 17(0,-16) 18(0,-17) 19(0,-18) 20(0,-19) 21(0,-20)
F.SilkS:
  lines w0.12: -0.685,0 -0.685,0.685 0,0.685 ; 0.394,-20.56 1.31,-20.56 1.31,0.56 0.685,0.56 ; 0.468,-19.5 1.31,-19.5 ; 0.468,-18.5 1.31,-18.5 ; 0.468,-17.5 1.31,-17.5 ; 0.468,-16.5 1.31,-16.5 ; 0.468,-15.5 1.31,-15.5 ; 0.468,-14.5 1.31,-14.5 ; 0.468,-13.5 1.31,-13.5 ; 0.468,-12.5 1.31,-12.5 ; 0.468,-11.5 1.31,-11.5 ; 0.468,-10.5 1.31,-10.5 ; 0.468,-9.5 1.31,-9.5 ; 0.468,-8.5 1.31,-8.5 ; 0.468,-7.5 1.31,-7.5 ; 0.468,-6.5 1.31,-6.5 ; 0.468,-5.5 1.31,-5.5 ; 0.468,-4.5 1.31,-4.5 ; 0.468,-3.5 1.31,-3.5 ; 0.468,-2.5 1.31,-2.5 ; 0.468,-1.5 1.31,-1.5 ; 0.685,-0.5 1.31,-0.5 ; 1.31,-20.21 3.31,-20.21 3.31,-19.79 1.31,-19.79 ; 1.31,-19.21 3.31,-19.21 3.31,-18.79 1.31,-18.79 ; 1.31,-18.21 3.31,-18.21 3.31,-17.79 1.31,-17.79 ; 1.31,-17.21 3.31,-17.21 3.31,-16.79 1.31,-16.79 ; 1.31,-16.21 3.31,-16.21 3.31,-15.79 1.31,-15.79 ; 1.31,-15.21 3.31,-15.21 3.31,-14.79 1.31,-14.79 ; 1.31,-14.21 3.31,-14.21 3.31,-13.79 1.31,-13.79 ; 1.31,-13.21 3.31,-13.21 3.31,-12.79 1.31,-12.79 ; 1.31,-12.21 3.31,-12.21 3.31,-11.79 1.31,-11.79 ; 1.31,-11.21 3.31,-11.21 3.31,-10.79 1.31,-10.79 ; 1.31,-10.21 3.31,-10.21 3.31,-9.79 1.31,-9.79 ; 1.31,-9.21 3.31,-9.21 3.31,-8.79 1.31,-8.79 ; 1.31,-8.21 3.31,-8.21 3.31,-7.79 1.31,-7.79 ; 1.31,-7.21 3.31,-7.21 3.31,-6.79 1.31,-6.79 ; 1.31,-6.21 3.31,-6.21 3.31,-5.79 1.31,-5.79 ; 1.31,-5.21 3.31,-5.21 3.31,-4.79 1.31,-4.79 ; 1.31,-4.21 3.31,-4.21 3.31,-3.79 1.31,-3.79 ; 1.31,-3.21 3.31,-3.21 3.31,-2.79 1.31,-2.79 ; 1.31,-2.21 3.31,-2.21 3.31,-1.79 1.31,-1.79 ; 1.31,-1.21 3.31,-1.21 3.31,-0.79 1.31,-0.79 ; 1.31,-0.21 3.31,-0.21 3.31,0.21 1.31,0.21 ; 1.31,-0.09 3.31,-0.09 ; 1.31,0.03 3.31,0.03 ; 1.31,0.15 3.31,0.15
F.CrtYd:
  lines w0.05: -1,-21 -1,1 3.75,1 3.75,-21 -1,-21
F.Fab:
  lines w0.1: 0.25,-20.15 -0.15,-20.15 -0.15,-19.85 0.25,-19.85 ; 0.25,-19.15 -0.15,-19.15 -0.15,-18.85 0.25,-18.85 ; 0.25,-18.15 -0.15,-18.15 -0.15,-17.85 0.25,-17.85 ; 0.25,-17.15 -0.15,-17.15 -0.15,-16.85 0.25,-16.85 ; 0.25,-16.15 -0.15,-16.15 -0.15,-15.85 0.25,-15.85 ; 0.25,-15.15 -0.15,-15.15 -0.15,-14.85 0.25,-14.85 ; 0.25,-14.15 -0.15,-14.15 -0.15,-13.85 0.25,-13.85 ; 0.25,-13.15 -0.15,-13.15 -0.15,-12.85 0.25,-12.85 ; 0.25,-12.15 -0.15,-12.15 -0.15,-11.85 0.25,-11.85 ; 0.25,-11.15 -0.15,-11.15 -0.15,-10.85 0.25,-10.85 ; 0.25,-10.15 -0.15,-10.15 -0.15,-9.85 0.25,-9.85 ; 0.25,-9.15 -0.15,-9.15 -0.15,-8.85 0.25,-8.85 ; 0.25,-8.15 -0.15,-8.15 -0.15,-7.85 0.25,-7.85 ; 0.25,-7.15 -0.15,-7.15 -0.15,-6.85 0.25,-6.85 ; 0.25,-6.15 -0.15,-6.15 -0.15,-5.85 0.25,-5.85 ; 0.25,-5.15 -0.15,-5.15 -0.15,-4.85 0.25,-4.85 ; 0.25,-4.15 -0.15,-4.15 -0.15,-3.85 0.25,-3.85 ; 0.25,-3.15 -0.15,-3.15 -0.15,-2.85 0.25,-2.85 ; 0.25,-2.15 -0.15,-2.15 -0.15,-1.85 0.25,-1.85 ; 0.25,-1.15 -0.15,-1.15 -0.15,-0.85 0.25,-0.85 ; 0.25,-0.15 -0.15,-0.15 -0.15,0.15 0.25,0.15 ; 1.25,-20.15 3.25,-20.15 3.25,-19.85 1.25,-19.85 ; 1.25,-19.15 3.25,-19.15 3.25,-18.85 1.25,-18.85 ; 1.25,-18.15 3.25,-18.15 3.25,-17.85 1.25,-17.85 ; 1.25,-17.15 3.25,-17.15 3.25,-16.85 1.25,-16.85 ; 1.25,-16.15 3.25,-16.15 3.25,-15.85 1.25,-15.85 ; 1.25,-15.15 3.25,-15.15 3.25,-14.85 1.25,-14.85 ; 1.25,-14.15 3.25,-14.15 3.25,-13.85 1.25,-13.85 ; 1.25,-13.15 3.25,-13.15 3.25,-12.85 1.25,-12.85 ; 1.25,-12.15 3.25,-12.15 3.25,-11.85 1.25,-11.85 ; 1.25,-11.15 3.25,-11.15 3.25,-10.85 1.25,-10.85 ; 1.25,-10.15 3.25,-10.15 3.25,-9.85 1.25,-9.85 ; 1.25,-9.15 3.25,-9.15 3.25,-8.85 1.25,-8.85 ; 1.25,-8.15 3.25,-8.15 3.25,-7.85 1.25,-7.85 ; 1.25,-7.15 3.25,-7.15 3.25,-6.85 1.25,-6.85 ; 1.25,-6.15 3.25,-6.15 3.25,-5.85 1.25,-5.85 ; 1.25,-5.15 3.25,-5.15 3.25,-4.85 1.25,-4.85 ; 1.25,-4.15 3.25,-4.15 3.25,-3.85 1.25,-3.85 ; 1.25,-3.15 3.25,-3.15 3.25,-2.85 1.25,-2.85 ; 1.25,-2.15 3.25,-2.15 3.25,-1.85 1.25,-1.85 ; 1.25,-1.15 3.25,-1.15 3.25,-0.85 1.25,-0.85 ; 1.25,-0.15 3.25,-0.15 3.25,0.15 1.25,0.15 ; 0.25,-20.5 1.25,-20.5 1.25,0.5 0.5,0.5 0.25,0.25 0.25,-20.5
  text "'.Designator'" at 1.254,-12.428 h0.6

## PinHeader_1x21_P1.00mm_Vertical [mm]
pads (21):
  rect 0.85x0.85 hole 0.5: 1(0,0)
  rrect100% 0.85x0.85 hole 0.5: 2(0,-1) 3(0,-2) 4(0,-3) 5(0,-4) 6(0,-5) 7(0,-6) 8(0,-7) 9(0,-8) 10(0,-9) 11(0,-10) 12(0,-11) 13(0,-12) 14(0,-13) 15(0,-14) 16(0,-15) 17(0,-16) 18(0,-17) 19(0,-18) 20(0,-19) 21(0,-20)
F.SilkS:
  lines w0.12: -0.695,0 -0.695,0.685 0,0.685 ; -0.608,-0.685 -0.695,-0.685 -0.695,-20.56 -0.394,-20.56 ; 0.394,-20.56 0.695,-20.56 0.695,-0.685 0.608,-0.685
F.CrtYd:
  lines w0.05: -1.15,-21 -1.15,1 1.15,1 1.15,-21 -1.15,-21
F.Fab:
  lines w0.1: -0.635,-20.5 -0.635,0.182 -0.318,0.5 0.635,0.5 0.635,-20.5 -0.635,-20.5
  text "'.Designator'" at 0.639,-13.076 h0.76